# Altium footprint library 1.08-LED发光二极管.PcbLib: 72 footprints (part 1 of 5)
Each footprint in its own frame and in the unit in brackets; x right, y up, seen from the top. Pads: shape width x height; smd on the part's side, far side on the other; paste and mask are expansions set on the pad; w line width, h text height; cw(c..) or ccw(c..) is an arc to the next point about the centre after c.
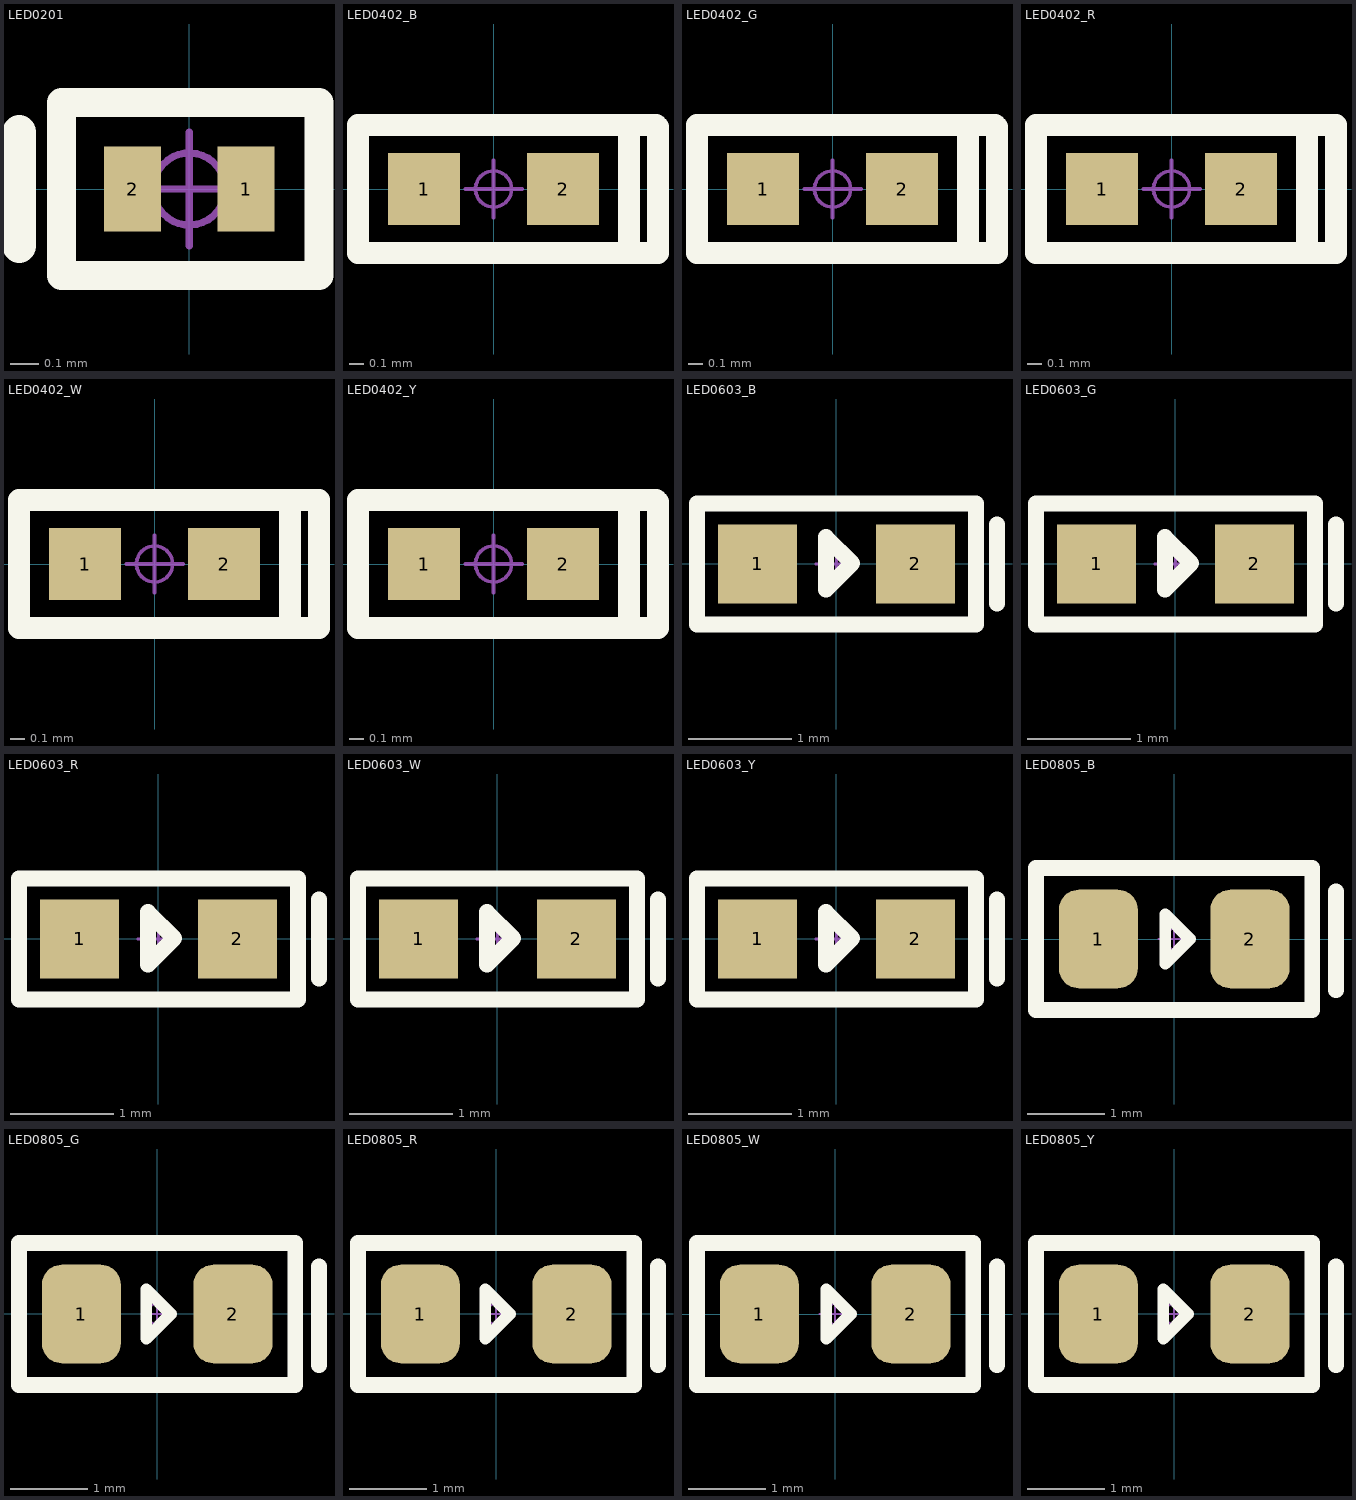
[diagram p0: the footprints below, top view; thin cyan lines are the x and y axes]

## LED0201 [mm] "0201 LED                                        联系卖家 免费查找封装"
pads (2):
  rect 0.2x0.3 smd: 1(0.2,0) 2(-0.2,0)
Top Overlay:
  lines w0.102: -0.45,-0.305 0.457,-0.305 0.457,0.305 -0.45,0.305 -0.45,-0.305
  lines w0.12: -0.6,-0.2 -0.6,0.2
Mechanical 15:
  circle w0.025: c0,0 r0.127
  lines w0.025: -0.2,0 0.2,0 ; 0,-0.2 0,0.2
3D body: height 0.11, standoff 0, extent -0.325,-0.175 0.325,0.175
3D body: height 0.19, standoff 0.1, extent -0.325,-0.175 0.325,0.175

## LED0402_B [mil] "蓝色0402LED"
pads (2):
  rect 20x20 smd: 1(-19.23,0) 2(19.23,0)
Top Overlay:
  lines w6: -31.5,-17.72 45.5,-17.72 45.5,17.22 45,17.72 -31.5,17.72 ; -37.5,-17.72 -37.5,17.72 37.5,17.72 37.5,-17.72 -37.5,-17.72
Mechanical 15:
  circle w1: c0,0 r5
  lines w1: -7.87,0 7.87,0 ; 0,-7.87 0,7.87
3D body: height 8.66, standoff 3.54, extent -13.78,-9.84 13.78,9.85
3D body: height 3.94, standoff 0, extent -19.69,-9.84 19.68,9.85

## LED0402_G [mil] "绿色0402LED"
pads (2):
  rect 20x20 smd: 1(-19.23,0) 2(19.23,0)
Top Overlay:
  lines w6: -31.5,-17.72 45.5,-17.72 45.5,17.22 45,17.72 -31.5,17.72 ; -37.5,-17.72 -37.5,17.72 37.5,17.72 37.5,-17.72 -37.5,-17.72
Mechanical 15:
  circle w1: c0,0 r5
  lines w1: -7.87,0 7.87,0 ; 0,-7.87 0,7.87
3D body: height 8.07, standoff 2.95, extent -13.78,-9.84 13.78,9.85
3D body: height 3.94, standoff 0, extent -19.68,-9.84 19.69,9.84

## LED0402_R [mil] "红色0402LED"
pads (2):
  rect 20x20 smd: 1(-19.23,0) 2(19.23,0)
Top Overlay:
  lines w6: -31.5,-17.72 45.5,-17.72 45.5,17.72 -31.5,17.72 ; -37.5,-17.72 37.5,-17.72 37.5,17.72 -37.5,17.72 -37.5,-17.72
Mechanical 15:
  circle w1: c0,0 r5
  lines w1: -7.87,0 7.87,0 ; 0,-7.87 0,7.87
3D body: height 8.07, standoff 2.95, extent -13.78,-9.84 13.78,9.85
3D body: height 3.94, standoff 0, extent -19.68,-9.84 19.69,9.85

## LED0402_W [mil] "白色0402LED                                联系卖家 免费查找封装"
pads (2):
  rect 20x20 smd: 1(-19.23,0) 2(19.23,0)
Top Overlay:
  lines w6: -31.5,-17.72 45.5,-17.72 45.5,17.72 -31.5,17.72 ; -37.5,-17.72 -37.5,17.72 37.5,17.72 37.5,-17.72 -37.5,-17.72
Mechanical 15:
  circle w1: c0,0 r5
  lines w1: -7.87,0 7.87,0 ; 0,-7.87 0,7.87
3D body: height 8.07, standoff 2.95, extent -13.78,-9.85 13.78,9.84
3D body: height 3.94, standoff 0, extent -19.68,-9.84 19.69,9.85

## LED0402_Y [mil] "黄色0402LED                                联系卖家 免费查找封装"
pads (2):
  rect 20x20 smd: 1(-19.23,0) 2(19.23,0)
Top Overlay:
  lines w6: -31.5,-17.72 45.5,-17.72 45.5,17.22 45,17.72 -31.5,17.72 ; -37.5,-17.72 -37.5,17.72 37.5,17.72 37.5,-17.72 -37.5,-17.72
Mechanical 15:
  circle w1: c0,0 r5
  lines w1: -7.87,0 7.87,0 ; 0,-7.87 0,7.87
3D body: height 8.66, standoff 3.54, extent -13.77,-9.84 13.78,9.84
3D body: height 3.94, standoff 0, extent -19.69,-9.85 19.69,9.84

## LED0603_B [mil] "蓝色0603LED"
pads (2):
  rect 30x30 smd: 1(-30,0) 2(30,0)
Top Overlay:
  lines w6: 61,-15 61,15 ; -53,-23 -53,23 53,23 53,-23 -53,-23 ; -4,-9.75 6,0.25 -4,10.25 -4,-9.75
Mechanical 15:
  circle w1: c0,0 r5
  lines w1: -7.88,0 7.87,0 ; 0,-7.88 0,7.87
3D body: height 0, standoff 0, extent 0,0 0,0
3D body: height 18.36, standoff -0.04, extent -31.49,-15.79 31.5,15.79

## LED0603_G [mil] "绿色0603LED"
pads (2):
  rect 30x30 smd: 1(-30,0) 2(30,0)
Top Overlay:
  lines w6: 61,-15 61,15 ; -53,-23 53,-23 53,23 -53,23 -53,-23 ; -4,-9.75 -4,10.25 6,0.25 -4,-9.75
Mechanical 15:
  circle w1: c0,0 r5
  lines w1: -7.87,0 7.87,0 ; 0,-7.87 0,7.87
3D body: height 0, standoff 0, extent 0,0 0,0
3D body: height 18.36, standoff -0.04, extent -31.5,-15.79 31.5,15.79

## LED0603_R [mil] "红色0603LED"
pads (2):
  rect 30x30 smd: 1(-30,0) 2(30,0)
Top Overlay:
  lines w6: 61,-15 61,15 ; -53,-23 -53,23 53,23 53,-23 -53,-23 ; -4,-9.75 6,0.25 -4,10.25 -4,-9.75
Mechanical 15:
  circle w1: c0,0 r5
  lines w1: -7.88,0 7.87,0 ; 0,-7.88 0,7.87
3D body: height 18.36, standoff -0.04, extent -31.49,-15.78 31.5,15.8
3D body: height 0, standoff 0, extent 0,0 0,0

## LED0603_W [mil] "白色0603LED"
pads (2):
  rect 30x30 smd: 1(-30,0) 2(30,0)
Top Overlay:
  lines w6: 61,-15 61,15 ; -53,-23 -53,23 53,23 53,-23 -53,-23 ; -4,-9.75 6,0.25 -4,10.25 -4,-9.75
Mechanical 15:
  circle w1: c0,0 r5
  lines w1: -7.88,0 7.87,0 ; 0,-7.88 0,7.87
3D body: height 18.36, standoff -0.04, extent -31.49,-15.78 31.5,15.8
3D body: height 0, standoff 0, extent 0,0 0,0

## LED0603_Y [mil] "黄色0603LED"
pads (2):
  rect 30x30 smd: 1(-30,0) 2(30,0)
Top Overlay:
  lines w6: 61,-15 61,15 ; -53,-23 53,-23 53,23 -53,23 -53,-23 ; -4,-9.75 -4,10.25 6,0.25 -4,-9.75
Mechanical 15:
  circle w1: c0,0 r5
  lines w1: -7.87,0 7.87,0 ; 0,-7.87 0,7.87
3D body: height 18.36, standoff -0.04, extent -31.5,-15.79 31.5,15.79
3D body: height 0, standoff 0, extent 0,0 0,0

## LED0805_B [mil] "蓝色0805LED"
pads (2):
  rrect50% 40x50 smd: 1(-38.4,0) 2(38.4,0)
Top Overlay:
  lines w6: -4.5,-12.5 8,0 -4.5,12.5 -4.5,-12.5
  lines w8: 82,-26 82,24 ; -70,-36 -70,36 70,36 70,-36 -70,-36
Mechanical 15:
  circle w1: c0,0 r5
  lines w1: -7.87,0 7.88,0 ; 0,-7.87 0,7.88
3D body: height 31.69, standoff 12.01, extent -29.52,-24.6 29.53,24.61
3D body: height 26.34, standoff -0.04, extent -39.37,-24.65 39.37,24.65

## LED0805_G [mil] "绿色0805LED            联系卖家 免费查找封装"
pads (2):
  rrect50% 40x50 smd: 1(-38.4,0) 2(38.4,0)
Top Overlay:
  lines w6: -5.5,-12.5 7,0 -5.5,12.5 -5.5,-12.5
  lines w8: 82,-26 82,24 ; -70,-36 -70,36 70,36 70,-36 -70,-36
Mechanical 15:
  circle w1: c0,0 r5
  lines w1: -7.87,0 7.87,0 ; 0,-7.87 0,7.87
3D body: height 26.34, standoff -0.04, extent -39.37,-24.65 39.37,24.64
3D body: height 31.69, standoff 12.01, extent -29.53,-24.6 29.53,24.6

## LED0805_R [mil] "红色0805LED            联系卖家 免费查找封装"
pads (2):
  rrect50% 40x50 smd: 1(-38.4,0) 2(38.4,0)
Top Overlay:
  lines w6: -5.5,-12.5 7,0 -5.5,12.5 -5.5,-12.5
  lines w8: 82,-26 82,24 ; -70,-36 -70,36 70,36 70,-36 -70,-36
Mechanical 15:
  circle w1: c0,0 r5
  lines w1: -7.87,0 7.87,0 ; 0,-7.87 0,7.87
3D body: height 31.69, standoff 12.01, extent -29.53,-24.6 29.53,24.61
3D body: height 26.34, standoff -0.04, extent -39.37,-24.65 39.37,24.64

## LED0805_W [mil] "白色0805LED"
pads (2):
  rrect50% 40x50 smd: 1(-38.4,0) 2(38.4,0)
Top Overlay:
  lines w6: -4.5,-12.5 -4.5,12.5 8,0 -4.5,-12.5
  lines w8: 82,-26 82,24 ; -70,-36 70,-36 70,36 -70,36 -70,-36
Mechanical 15:
  circle w1: c0,0 r5
  lines w1: -7.87,0 7.88,0 ; 0,-7.87 0,7.88
3D body: height 31.69, standoff 12.01, extent -29.53,-24.6 29.53,24.6
3D body: height 26.34, standoff -0.04, extent -39.37,-24.65 39.37,24.64

## LED0805_Y [mil] "黄色0805LED"
pads (2):
  rrect50% 40x50 smd: 1(-38.4,0) 2(38.4,0)
Top Overlay:
  lines w6: -5.5,-12.5 -5.5,12.5 7,0 -5.5,-12.5
  lines w8: 82,-26 82,24 ; -70,-36 -70,36 70,36 70,-36 -70,-36
Mechanical 15:
  circle w1: c0,0 r5
  lines w1: -7.87,0 7.87,0 ; 0,-7.87 0,7.87
3D body: height 31.69, standoff 12.01, extent -29.53,-24.61 29.53,24.6
3D body: height 26.34, standoff -0.04, extent -39.37,-24.65 39.37,24.64